# Altium schematic symbol library Linear Technology Comparators.SchLib: 630 symbols (part 12 of 16)
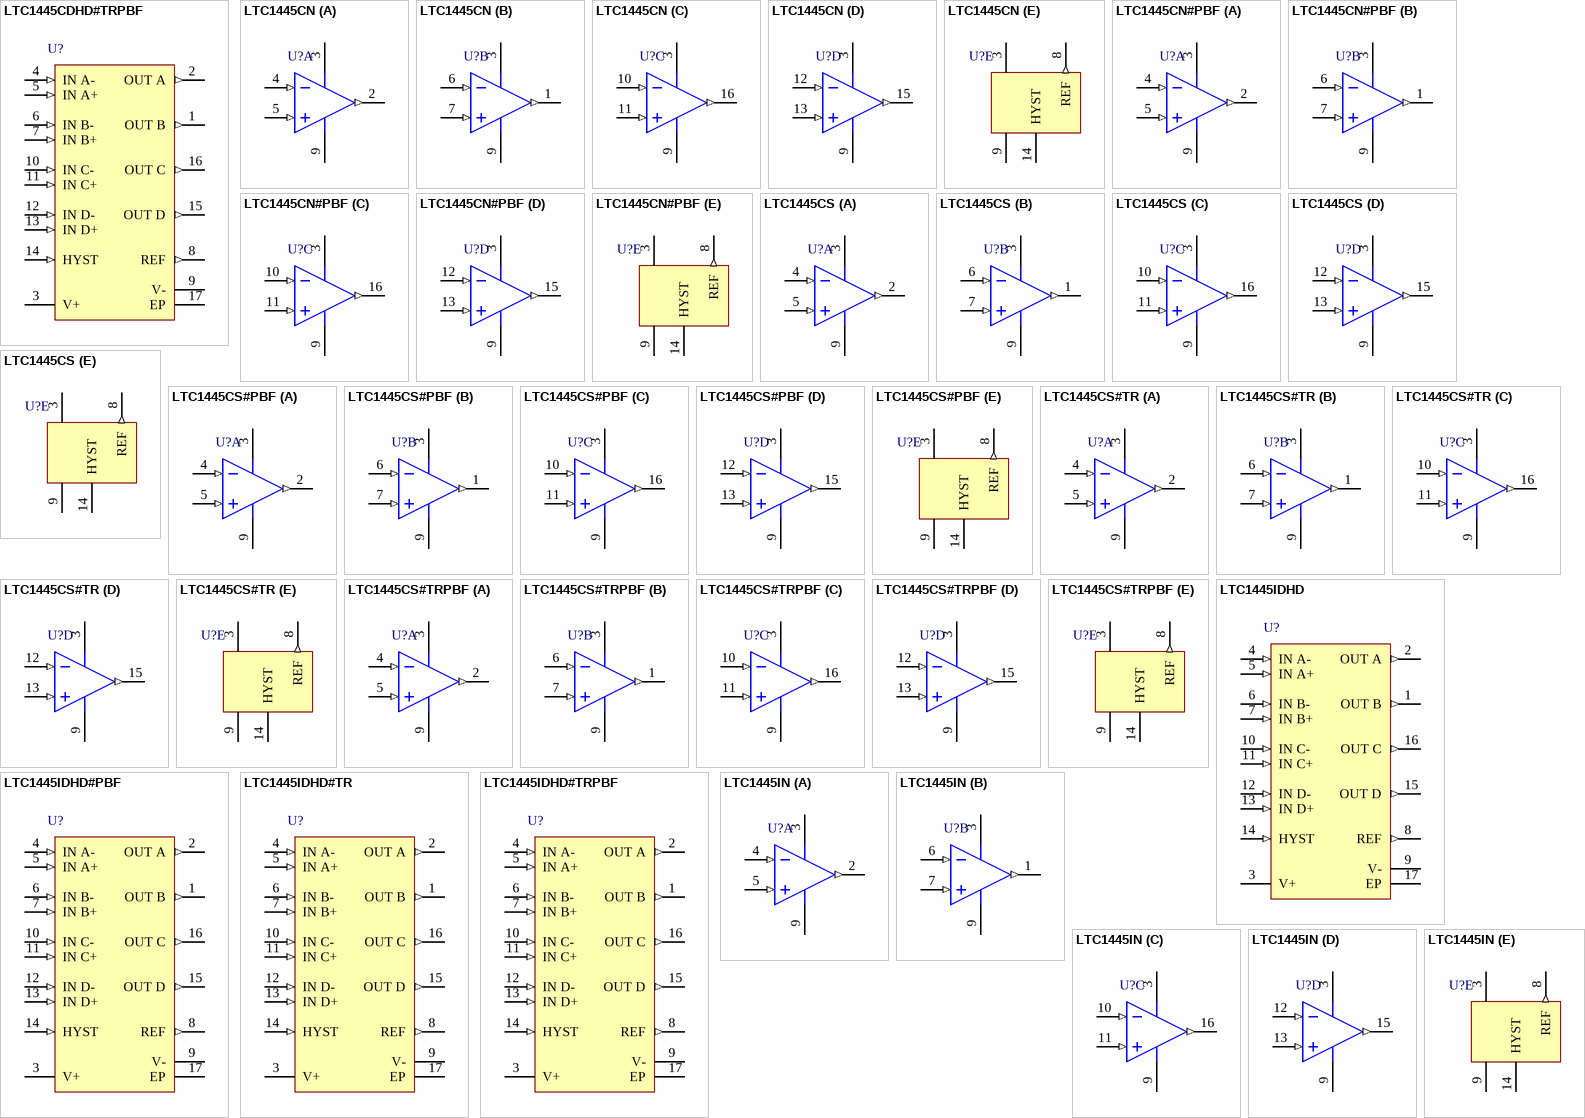
[diagram p35: symbols LTC1445CDHD#TRPBF to LTC1445IN]

## LTC1445IDHD#TRPBF
designator U?
Ultralow Power Comparator with Reference, 4 Channels, 2 to 11 V, -40 to +85 degC, 16-pin Plastic DFN (DHD16), Tape and Reel; Generic Part Number: LTC1445; Manufacturer: Linear Technology; PartNumber: LTC1445IDHD#TRPBF; Channels (#): 4; Supply Current (uA) Guaranteed: 8.5; Supply Current (uA) Typical: 5.5; Supply Voltage Range: 2 to 11 V; Vos (mV) Typical: 3; Vs Max (V): 11; Vs Min (V): 2; DatasheetVersion: Rev E; PackageReference: DHD16; PackageDescription: 16-Pin Plastic DFN, Body 5 × 4 mm, Pitch 0.5 mm; Supplier 1: Digi-Key; Supplier Part Number 1: LTC1445IDHD#TRPBF-ND; Features: Reference, Comparator; Prop Delay (us): 4; RoHS: Y; Mounting Technology: Surface Mount; Code_JEDEC: MO-229; ComponentLink1Description: Manufacturer URL; ComponentLink1URL: http://www.linear.com/; ComponentLink2Description: Datasheet; ComponentLink2URL: http://cds.linear.com/docs/en/datasheet/144345fe.pdf; ComponentLink3Description: Package Specification; ComponentLink3URL: http://cds.linear.com/docs/en/packaging/DFN_16_05-08-1707.pdf
footprint LT-DHD16_V (SON, 16-Leads, Body 5x4mm, Pitch 0.5mm, Thermal Pad 4.34x2.44mm)
pins: 1 OUT B (out) "Comparator B Output. Output can source up to 40mA and sink 5mA.", 2 OUT A (out) "Comparator A Output. Output can source up to 40mA and sink 5mA.", 3 V+ (power) "Positive Supply.", 4 IN A- (in) "Inverting Input of Comparator A. Input common mode range from V- to V+ - 1.3V. Input current typically 10pA at 25degreesC.", 5 IN A+ (in) "Noninverting Input of Comparator A. Inputcommon mode range from V- to V+ -1.3V. Input current typically 10pA at 25degreesC.", 6 IN B- (in) "Inverting Input of Comparator B. Input common mode range from V- to V+ - 1.3V. Input current typically 10pA at 25degreesC.", 7 IN B+ (in) "Noninverting Input of Comparator B. Inputcommon mode range from V- to V+ -1.3V. Input current typically 10pA at 25degreesC.", 8 REF (out) "Reference Output. With respect to V-. Can source up to 200uA and sink 15uA at 25degreesC. Drive 0.01uF bypass capacitor without oscillation.", 9 V- (power) "Negative Supply.", 10 IN C- (in) "Inverting Input of Comparator C. Input common mode range from V- to V+ - 1.3V. Input current typically 10pA at 25degreesC.", 11 IN C+ (in) "Noninverting Input of Comparator C. Inputcommon mode range from V- to V+ -1.3V. Input current typically 10pA at 25degreesC.", 12 IN D- (in) "Inverting Input of Comparator D. Input common mode range from V- to V+ - 1.3V. Input current typically 10pA at 25degreesC.", 13 IN D+ (in) "Noninverting Input of ComparatorD. Inputcommon mode range from V- to V+ -1.3V. Input current typically 10pA at 25degreesC.", 14 HYST (in) "Hysteresis Input. Connect to REF if not used. Input voltage range is from VREF to VREF -50mV.", 15 OUT D (out) "Comparator D Output. Output can source up to 40mA and sink 5mA.", 16 OUT C (out) "Comparator C Output. Output can source up to 40mA and sink 5mA.", 17 EP "This pin is internally connected to V-. Connection is optional, but will improve thermal dissipation."

## LTC1445IN
designator U?
Ultralow Power Comparator with Reference, 4 Channels, 2 to 11 V, -40 to +85 degC, 16-pin PDIP (N16); Generic Part Number: LTC1445; Manufacturer: Linear Technology; PartNumber: LTC1445IN; Channels (#): 4; Supply Current (uA) Guaranteed: 8.5; Supply Current (uA) Typical: 5.5; Supply Voltage Range: 2 to 11 V; Vos (mV) Typical: 3; Vs Max (V): 11; Vs Min (V): 2; DatasheetVersion: Rev E; PackageReference: N16; PackageDescription: 16-Pin PDIP, Body 19.305 x 6.35 mm, Pitch 2.54 mm; Features: Reference, Comparator; Prop Delay (us): 4; RoHS: N; Mounting Technology: Through Hole; ComponentLink1Description: Manufacturer URL; ComponentLink1URL: http://www.linear.com/; ComponentLink2Description: Datasheet; ComponentLink2URL: http://cds.linear.com/docs/en/datasheet/144345fe.pdf; ComponentLink3Description: Package Specification; ComponentLink3URL: http://cds.linear.com/docs/en/packaging/05081510_I_N16.pdf
footprint LT-N16 (DIP, 16-Leads, Body 19.558x6.477mm, Pitch 2.54mm)
pins on every part: 3 V+ (power), 9 V- (power)
part A pins: 2 OUTA (out), 4 INA- (in), 5 INA+ (in)
part B pins: 1 OUTB (out), 6 INB- (in), 7 INB+ (in)
part C pins: 10 INC- (in), 11 INC+ (in), 16 OUTC (out)
part D pins: 12 IND- (in), 13 IND+ (in), 15 OUTD (out)
part E pins: 8 REF (out), 14 HYST

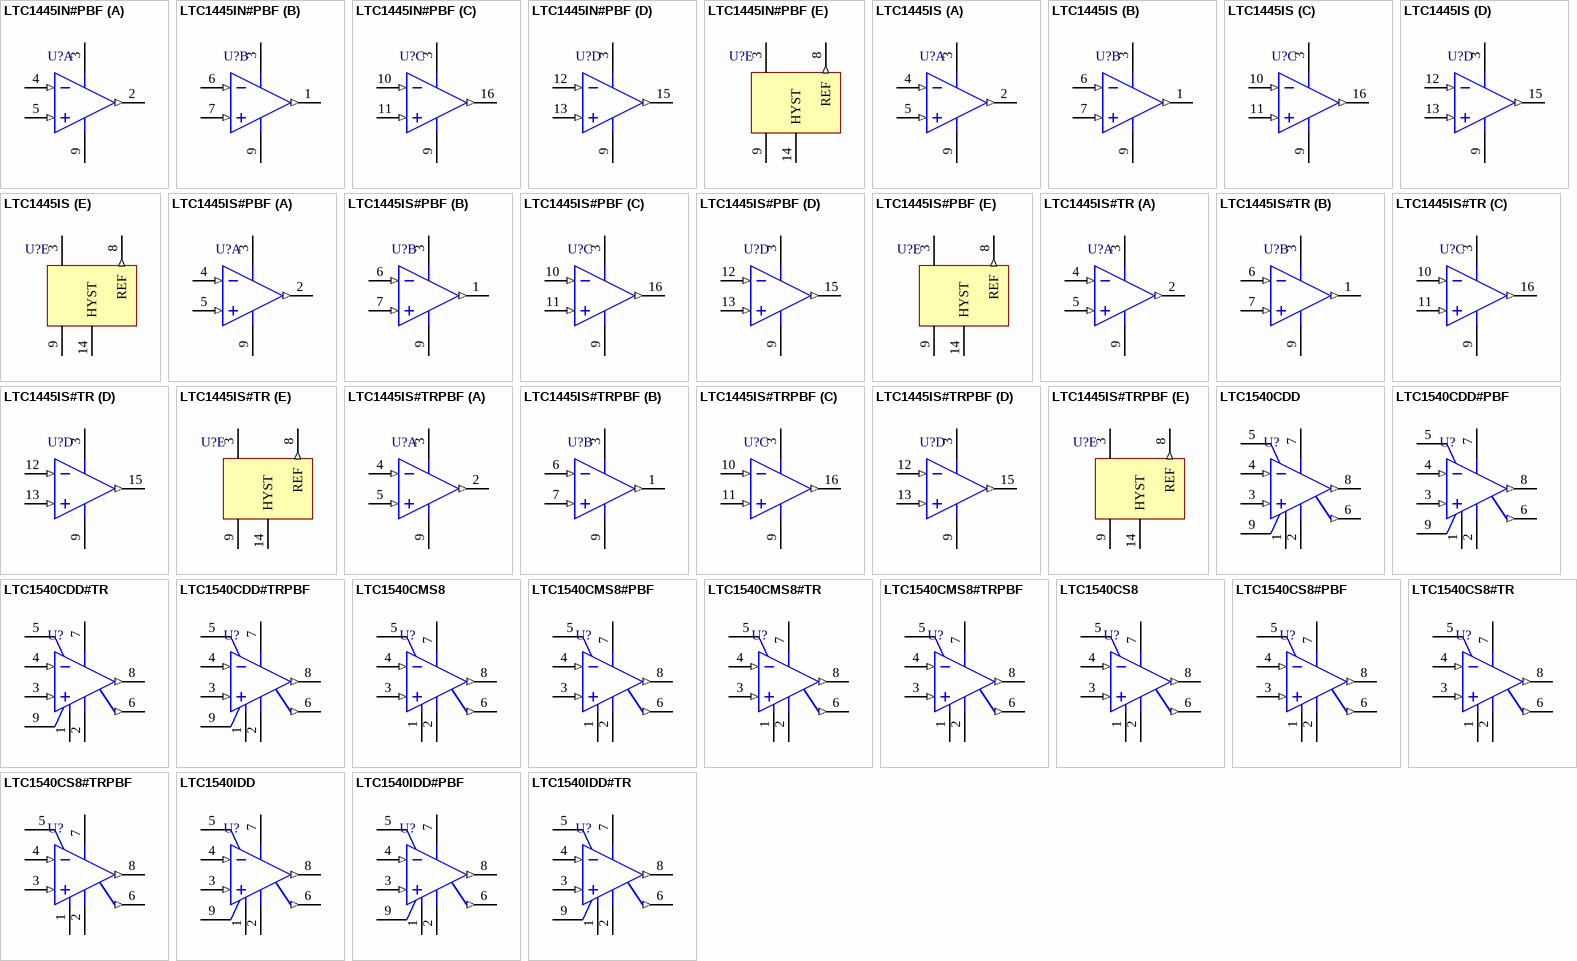
[diagram p19: symbols LTC1445IN#PBF to LTC1540IDD#TR]

## LTC1445IN#PBF
designator U?
Ultralow Power Comparator with Reference, 4 Channels, 2 to 11 V, -40 to +85 degC, 16-pin PDIP (N16); Generic Part Number: LTC1445; Manufacturer: Linear Technology; PartNumber: LTC1445IN#PBF; Channels (#): 4; Supply Current (uA) Guaranteed: 8.5; Supply Current (uA) Typical: 5.5; Supply Voltage Range: 2 to 11 V; Vos (mV) Typical: 3; Vs Max (V): 11; Vs Min (V): 2; DatasheetVersion: Rev E; PackageReference: N16; PackageDescription: 16-Pin PDIP, Body 19.305 x 6.35 mm, Pitch 2.54 mm; Supplier 1: Digi-Key; Supplier Part Number 1: LTC1445IN#PBF-ND; Features: Reference, Comparator; Prop Delay (us): 4; RoHS: Y; Mounting Technology: Through Hole; ComponentLink1Description: Manufacturer URL; ComponentLink1URL: http://www.linear.com/; ComponentLink2Description: Datasheet; ComponentLink2URL: http://cds.linear.com/docs/en/datasheet/144345fe.pdf; ComponentLink3Description: Package Specification; ComponentLink3URL: http://cds.linear.com/docs/en/packaging/05081510_I_N16.pdf
footprint LT-N16 (DIP, 16-Leads, Body 19.558x6.477mm, Pitch 2.54mm)
pins on every part: 3 V+ (power), 9 V- (power)
part A pins: 2 OUTA (out), 4 INA- (in), 5 INA+ (in)
part B pins: 1 OUTB (out), 6 INB- (in), 7 INB+ (in)
part C pins: 10 INC- (in), 11 INC+ (in), 16 OUTC (out)
part D pins: 12 IND- (in), 13 IND+ (in), 15 OUTD (out)
part E pins: 8 REF (out), 14 HYST

## LTC1445IS
designator U?
Ultralow Power Comparator with Reference, 4 Channels, 2 to 11 V, -40 to +85 degC, 16-pin SOP (S16); Generic Part Number: LTC1445; Manufacturer: Linear Technology; PartNumber: LTC1445IS; Channels (#): 4; Supply Current (uA) Guaranteed: 8.5; Supply Current (uA) Typical: 5.5; Supply Voltage Range: 2 to 11 V; Vos (mV) Typical: 3; Vs Max (V): 11; Vs Min (V): 2; DatasheetVersion: Rev E; PackageReference: S16; PackageDescription: 16-Pin Plastic Small Outline, Body 9.91 x 3.9 mm, Pitch 1.27 mm; Supplier 1: Digi-Key; Supplier Part Number 1: LTC1445IS-ND; Supplier 2: Newark; Supplier Part Number 2: 56M1277; Features: Reference, Comparator; Prop Delay (us): 4; RoHS: N; Mounting Technology: Surface Mount; ComponentLink1Description: Manufacturer URL; ComponentLink1URL: http://www.linear.com/; ComponentLink2Description: Datasheet; ComponentLink2URL: http://cds.linear.com/docs/en/datasheet/144345fe.pdf; ComponentLink3Description: Package Specification; ComponentLink3URL: http://cds.linear.com/docs/en/packaging/05081610_G_S14.pdf
footprint LT-S16_N (SOIC, 16-Leads, Body 9.9x3.9mm, Pitch 1.27mm, IPC Medium Density)
footprint LT-S16_L (SOIC, 16-Leads, Body 9.9x3.9mm, Pitch 1.27mm, IPC High Density)
footprint LT-S16_M (SOIC, 16-Leads, Body 9.9x3.9mm, Pitch 1.27mm, IPC Low Density)
pins on every part: 3 V+ (power), 9 V- (power)
part A pins: 2 OUTA (out), 4 INA- (in), 5 INA+ (in)
part B pins: 1 OUTB (out), 6 INB- (in), 7 INB+ (in)
part C pins: 10 INC- (in), 11 INC+ (in), 16 OUTC (out)
part D pins: 12 IND- (in), 13 IND+ (in), 15 OUTD (out)
part E pins: 8 REF (out), 14 HYST

## LTC1445IS#PBF
designator U?
Ultralow Power Comparator with Reference, 4 Channels, 2 to 11 V, -40 to +85 degC, 16-pin SOP (S16); Generic Part Number: LTC1445; Manufacturer: Linear Technology; PartNumber: LTC1445IS#PBF; Channels (#): 4; Supply Current (uA) Guaranteed: 8.5; Supply Current (uA) Typical: 5.5; Supply Voltage Range: 2 to 11 V; Vos (mV) Typical: 3; Vs Max (V): 11; Vs Min (V): 2; DatasheetVersion: Rev E; PackageReference: S16; PackageDescription: 16-Pin Plastic Small Outline, Body 9.91 x 3.9 mm, Pitch 1.27 mm; Supplier 1: Digi-Key; Supplier Part Number 1: LTC1445IS#PBF-ND; Supplier 2: Farnell; Supplier Part Number 2: 2294789; Supplier 3: Newark; Supplier Part Number 3: 56M1278; Features: Reference, Comparator; Prop Delay (us): 4; RoHS: Y; Mounting Technology: Surface Mount; ComponentLink1Description: Manufacturer URL; ComponentLink1URL: http://www.linear.com/; ComponentLink2Description: Datasheet; ComponentLink2URL: http://cds.linear.com/docs/en/datasheet/144345fe.pdf; ComponentLink3Description: Package Specification; ComponentLink3URL: http://cds.linear.com/docs/en/packaging/05081610_G_S14.pdf
footprint LT-S16_N (SOIC, 16-Leads, Body 9.9x3.9mm, Pitch 1.27mm, IPC Medium Density)
footprint LT-S16_L (SOIC, 16-Leads, Body 9.9x3.9mm, Pitch 1.27mm, IPC High Density)
footprint LT-S16_M (SOIC, 16-Leads, Body 9.9x3.9mm, Pitch 1.27mm, IPC Low Density)
pins on every part: 3 V+ (power), 9 V- (power)
part A pins: 2 OUTA (out), 4 INA- (in), 5 INA+ (in)
part B pins: 1 OUTB (out), 6 INB- (in), 7 INB+ (in)
part C pins: 10 INC- (in), 11 INC+ (in), 16 OUTC (out)
part D pins: 12 IND- (in), 13 IND+ (in), 15 OUTD (out)
part E pins: 8 REF (out), 14 HYST

## LTC1445IS#TR
designator U?
Ultralow Power Comparator with Reference, 4 Channels, 2 to 11 V, -40 to +85 degC, 16-pin SOP (S16), Tape and Reel; Generic Part Number: LTC1445; Manufacturer: Linear Technology; PartNumber: LTC1445IS#TR; Channels (#): 4; Supply Current (uA) Guaranteed: 8.5; Supply Current (uA) Typical: 5.5; Supply Voltage Range: 2 to 11 V; Vos (mV) Typical: 3; Vs Max (V): 11; Vs Min (V): 2; DatasheetVersion: Rev E; PackageReference: S16; PackageDescription: 16-Pin Plastic Small Outline, Body 9.91 x 3.9 mm, Pitch 1.27 mm; Supplier 1: Digi-Key; Supplier Part Number 1: LTC1445IS#TR-ND; Supplier 2: Newark; Supplier Part Number 2: 56M1279; Features: Reference, Comparator; Prop Delay (us): 4; RoHS: N; Mounting Technology: Surface Mount; ComponentLink1Description: Manufacturer URL; ComponentLink1URL: http://www.linear.com/; ComponentLink2Description: Datasheet; ComponentLink2URL: http://cds.linear.com/docs/en/datasheet/144345fe.pdf; ComponentLink3Description: Package Specification; ComponentLink3URL: http://cds.linear.com/docs/en/packaging/05081610_G_S14.pdf
footprint LT-S16_N (SOIC, 16-Leads, Body 9.9x3.9mm, Pitch 1.27mm, IPC Medium Density)
footprint LT-S16_L (SOIC, 16-Leads, Body 9.9x3.9mm, Pitch 1.27mm, IPC High Density)
footprint LT-S16_M (SOIC, 16-Leads, Body 9.9x3.9mm, Pitch 1.27mm, IPC Low Density)
pins on every part: 3 V+ (power), 9 V- (power)
part A pins: 2 OUTA (out), 4 INA- (in), 5 INA+ (in)
part B pins: 1 OUTB (out), 6 INB- (in), 7 INB+ (in)
part C pins: 10 INC- (in), 11 INC+ (in), 16 OUTC (out)
part D pins: 12 IND- (in), 13 IND+ (in), 15 OUTD (out)
part E pins: 8 REF (out), 14 HYST

## LTC1445IS#TRPBF
designator U?
Ultralow Power Comparator with Reference, 4 Channels, 2 to 11 V, -40 to +85 degC, 16-pin SOP (S16), Tape and Reel; Generic Part Number: LTC1445; Manufacturer: Linear Technology; PartNumber: LTC1445IS#TRPBF; Channels (#): 4; Supply Current (uA) Guaranteed: 8.5; Supply Current (uA) Typical: 5.5; Supply Voltage Range: 2 to 11 V; Vos (mV) Typical: 3; Vs Max (V): 11; Vs Min (V): 2; DatasheetVersion: Rev E; PackageReference: S16; PackageDescription: 16-Pin Plastic Small Outline, Body 9.91 x 3.9 mm, Pitch 1.27 mm; Supplier 1: Digi-Key; Supplier Part Number 1: LTC1445IS#TRPBF-ND; Supplier 2: Newark; Supplier Part Number 2: 78T2496; Features: Reference, Comparator; Prop Delay (us): 4; RoHS: Y; Mounting Technology: Surface Mount; ComponentLink1Description: Manufacturer URL; ComponentLink1URL: http://www.linear.com/; ComponentLink2Description: Datasheet; ComponentLink2URL: http://cds.linear.com/docs/en/datasheet/144345fe.pdf; ComponentLink3Description: Package Specification; ComponentLink3URL: http://cds.linear.com/docs/en/packaging/05081610_G_S14.pdf
footprint LT-S16_N (SOIC, 16-Leads, Body 9.9x3.9mm, Pitch 1.27mm, IPC Medium Density)
footprint LT-S16_L (SOIC, 16-Leads, Body 9.9x3.9mm, Pitch 1.27mm, IPC High Density)
footprint LT-S16_M (SOIC, 16-Leads, Body 9.9x3.9mm, Pitch 1.27mm, IPC Low Density)
pins on every part: 3 V+ (power), 9 V- (power)
part A pins: 2 OUTA (out), 4 INA- (in), 5 INA+ (in)
part B pins: 1 OUTB (out), 6 INB- (in), 7 INB+ (in)
part C pins: 10 INC- (in), 11 INC+ (in), 16 OUTC (out)
part D pins: 12 IND- (in), 13 IND+ (in), 15 OUTD (out)
part E pins: 8 REF (out), 14 HYST

## LTC1540CDD
designator U?
Nanopower Comparator with Reference, 1 Channel, 2 to 11 V, 0 to +70 degC, 8-pin Plastic DFN (DD8); Generic Part Number: LTC1540; Manufacturer: Linear Technology; PartNumber: LTC1540CDD; Channels (#): 1; Prop Delay (us): 50; Supply Current (uA) Guaranteed: 0.68; Supply Current (uA) Typical: 0.3; Supply Voltage Range: 2 to 11 V; Vos (mV) Guaranteed: 12; Vs Max (V): 11; Vs Min (V): 2; DatasheetVersion: Rev A; PackageReference: DD8; PackageDescription: 8-Pin Plastic DFN, Body 3 × 3 mm, Pitch 0.5 mm; Supplier 1: Digi-Key; Supplier Part Number 1: LTC1540CDD-ND; Features: Reference, Comparator; RoHS: N; Vos (mV) Typical: 12; Mounting Technology: Surface Mount; Code_JEDEC: M0-229; ComponentLink1Description: Manufacturer URL; ComponentLink1URL: http://www.linear.com/; ComponentLink2Description: Datasheet; ComponentLink2URL: http://cds.linear.com/docs/en/datasheet/1540fas.pdf; ComponentLink3Description: Package Specification; ComponentLink3URL: http://cds.linear.com/docs/en/packaging/DFN_8_05-08-1698.pdf
footprint LT-DD8_V (SON, 8-Leads, Body 3x3mm, Pitch 0.5mm, Thermal Pad 2.38x1.65mm)
pins: 1 GND (power) "Ground. Connect to V- for single supply operation.", 2 V- (power) "Negative Supply. Potential should be more negative than GND. Connect to ground for single supply operation.", 3 IN+ (in) "Noninverting Comparator Input. Input common mode range from V- to V+ -1.3V. Input current typically 10pA at 25degreesC.", 4 IN- (in) "Inverting Comparator Input. Input common mode range from V- to V+ -1.3V. Input current typically 10pA at 25degreesC.", 5 HYST "Hysteresis Input. Connect to REF if not used. Input voltage range is from VREF to VREF-50mV.", 6 REF (out) "Reference Output. 1.182V with respect to V-. Can source up to 1mA and sink 10uA at 25degreesC. Drive 0.01uF bypass capacitor without oscillation.", 7 V+ (power) "Positive Supply operating voltage is from 2V to 11V.", 8 OUT (out) "Comparator CMOS Output. Swings from GND to V+. Output can source up to 40mA and sink 5mA.", 9 EP (power) "Exposed Pad"

## LTC1540CDD#PBF
designator U?
Nanopower Comparator with Reference, 1 Channel, 2 to 11 V, 0 to +70 degC, 8-pin Plastic DFN (DD8); Generic Part Number: LTC1540; Manufacturer: Linear Technology; PartNumber: LTC1540CDD#PBF; Channels (#): 1; Prop Delay (us): 50; Supply Current (uA) Guaranteed: 0.68; Supply Current (uA) Typical: 0.3; Supply Voltage Range: 2 to 11 V; Vos (mV) Guaranteed: 12; Vs Max (V): 11; Vs Min (V): 2; DatasheetVersion: Rev A; PackageReference: DD8; PackageDescription: 8-Pin Plastic DFN, Body 3 × 3 mm, Pitch 0.5 mm; Supplier 1: Digi-Key; Supplier Part Number 1: LTC1540CDD#PBF-ND; Supplier 2: Farnell; Supplier Part Number 2: 2295500; Supplier 3: Newark; Supplier Part Number 3: 56M1857; Features: Reference, Comparator; RoHS: Y; Vos (mV) Typical: 12; Mounting Technology: Surface Mount; Code_JEDEC: M0-229; ComponentLink1Description: Manufacturer URL; ComponentLink1URL: http://www.linear.com/; ComponentLink2Description: Datasheet; ComponentLink2URL: http://cds.linear.com/docs/en/datasheet/1540fas.pdf; ComponentLink3Description: Package Specification; ComponentLink3URL: http://cds.linear.com/docs/en/packaging/DFN_8_05-08-1698.pdf
footprint LT-DD8_V (SON, 8-Leads, Body 3x3mm, Pitch 0.5mm, Thermal Pad 2.38x1.65mm)
pins: 1 GND (power) "Ground. Connect to V- for single supply operation.", 2 V- (power) "Negative Supply. Potential should be more negative than GND. Connect to ground for single supply operation.", 3 IN+ (in) "Noninverting Comparator Input. Input common mode range from V- to V+ -1.3V. Input current typically 10pA at 25degreesC.", 4 IN- (in) "Inverting Comparator Input. Input common mode range from V- to V+ -1.3V. Input current typically 10pA at 25degreesC.", 5 HYST "Hysteresis Input. Connect to REF if not used. Input voltage range is from VREF to VREF-50mV.", 6 REF (out) "Reference Output. 1.182V with respect to V-. Can source up to 1mA and sink 10uA at 25degreesC. Drive 0.01uF bypass capacitor without oscillation.", 7 V+ (power) "Positive Supply operating voltage is from 2V to 11V.", 8 OUT (out) "Comparator CMOS Output. Swings from GND to V+. Output can source up to 40mA and sink 5mA.", 9 EP (power) "Exposed Pad"

## LTC1540CDD#TR
designator U?
Nanopower Comparator with Reference, 1 Channel, 2 to 11 V, 0 to +70 degC, 8-pin Plastic DFN (DD8), Tape and Reel; Generic Part Number: LTC1540; Manufacturer: Linear Technology; PartNumber: LTC1540CDD#TR; Channels (#): 1; Prop Delay (us): 50; Supply Current (uA) Guaranteed: 0.68; Supply Current (uA) Typical: 0.3; Supply Voltage Range: 2 to 11 V; Vos (mV) Guaranteed: 12; Vs Max (V): 11; Vs Min (V): 2; DatasheetVersion: Rev A; PackageReference: DD8; PackageDescription: 8-Pin Plastic DFN, Body 3 × 3 mm, Pitch 0.5 mm; Supplier 1: Digi-Key; Supplier Part Number 1: LTC1540CDD#TR-ND; Features: Reference, Comparator; RoHS: N; Vos (mV) Typical: 12; Mounting Technology: Surface Mount; Code_JEDEC: M0-229; ComponentLink1Description: Manufacturer URL; ComponentLink1URL: http://www.linear.com/; ComponentLink2Description: Datasheet; ComponentLink2URL: http://cds.linear.com/docs/en/datasheet/1540fas.pdf; ComponentLink3Description: Package Specification; ComponentLink3URL: http://cds.linear.com/docs/en/packaging/DFN_8_05-08-1698.pdf
footprint LT-DD8_V (SON, 8-Leads, Body 3x3mm, Pitch 0.5mm, Thermal Pad 2.38x1.65mm)
pins: 1 GND (power) "Ground. Connect to V- for single supply operation.", 2 V- (power) "Negative Supply. Potential should be more negative than GND. Connect to ground for single supply operation.", 3 IN+ (in) "Noninverting Comparator Input. Input common mode range from V- to V+ -1.3V. Input current typically 10pA at 25degreesC.", 4 IN- (in) "Inverting Comparator Input. Input common mode range from V- to V+ -1.3V. Input current typically 10pA at 25degreesC.", 5 HYST "Hysteresis Input. Connect to REF if not used. Input voltage range is from VREF to VREF-50mV.", 6 REF (out) "Reference Output. 1.182V with respect to V-. Can source up to 1mA and sink 10uA at 25degreesC. Drive 0.01uF bypass capacitor without oscillation.", 7 V+ (power) "Positive Supply operating voltage is from 2V to 11V.", 8 OUT (out) "Comparator CMOS Output. Swings from GND to V+. Output can source up to 40mA and sink 5mA.", 9 EP (power) "Exposed Pad"

## LTC1540CDD#TRPBF
designator U?
Nanopower Comparator with Reference, 1 Channel, 2 to 11 V, 0 to +70 degC, 8-pin Plastic DFN (DD8), Tape and Reel; Generic Part Number: LTC1540; Manufacturer: Linear Technology; PartNumber: LTC1540CDD#TRPBF; Channels (#): 1; Prop Delay (us): 50; Supply Current (uA) Guaranteed: 0.68; Supply Current (uA) Typical: 0.3; Supply Voltage Range: 2 to 11 V; Vos (mV) Guaranteed: 12; Vs Max (V): 11; Vs Min (V): 2; DatasheetVersion: Rev A; PackageReference: DD8; PackageDescription: 8-Pin Plastic DFN, Body 3 × 3 mm, Pitch 0.5 mm; Supplier 1: Digi-Key; Supplier Part Number 1: LTC1540CDD#TRPBF-ND; Features: Reference, Comparator; RoHS: Y; Vos (mV) Typical: 12; Mounting Technology: Surface Mount; Code_JEDEC: M0-229; ComponentLink1Description: Manufacturer URL; ComponentLink1URL: http://www.linear.com/; ComponentLink2Description: Datasheet; ComponentLink2URL: http://cds.linear.com/docs/en/datasheet/1540fas.pdf; ComponentLink3Description: Package Specification; ComponentLink3URL: http://cds.linear.com/docs/en/packaging/DFN_8_05-08-1698.pdf
footprint LT-DD8_V (SON, 8-Leads, Body 3x3mm, Pitch 0.5mm, Thermal Pad 2.38x1.65mm)
pins: 1 GND (power) "Ground. Connect to V- for single supply operation.", 2 V- (power) "Negative Supply. Potential should be more negative than GND. Connect to ground for single supply operation.", 3 IN+ (in) "Noninverting Comparator Input. Input common mode range from V- to V+ -1.3V. Input current typically 10pA at 25degreesC.", 4 IN- (in) "Inverting Comparator Input. Input common mode range from V- to V+ -1.3V. Input current typically 10pA at 25degreesC.", 5 HYST "Hysteresis Input. Connect to REF if not used. Input voltage range is from VREF to VREF-50mV.", 6 REF (out) "Reference Output. 1.182V with respect to V-. Can source up to 1mA and sink 10uA at 25degreesC. Drive 0.01uF bypass capacitor without oscillation.", 7 V+ (power) "Positive Supply operating voltage is from 2V to 11V.", 8 OUT (out) "Comparator CMOS Output. Swings from GND to V+. Output can source up to 40mA and sink 5mA.", 9 EP (power) "Exposed Pad"

## LTC1540CMS8
designator U?
Nanopower Comparator with Reference, 1 Channel, 2 to 11 V, 0 to +70 degC, 8-pin Plastic MSOP (MS8); Generic Part Number: LTC1540; Manufacturer: Linear Technology; PartNumber: LTC1540CMS8; Channels (#): 1; Prop Delay (us): 50; Supply Current (uA) Guaranteed: 0.68; Supply Current (uA) Typical: 0.3; Supply Voltage Range: 2 to 11 V; Vos (mV) Guaranteed: 12; Vs Max (V): 11; Vs Min (V): 2; DatasheetVersion: Rev A; PackageReference: MS8; PackageDescription: 8-Pin Plastic MSOP, Body 3 x 3 mm, Pitch 0.65 mm; Supplier 1: Digi-Key; Supplier Part Number 1: LTC1540CMS8-ND; Supplier 2: Newark; Supplier Part Number 2: 56M1860; Features: Reference, Comparator; RoHS: N; Vos (mV) Typical: 12; Mounting Technology: Surface Mount; ComponentLink1Description: Manufacturer URL; ComponentLink1URL: http://www.linear.com/; ComponentLink2Description: Datasheet; ComponentLink2URL: http://cds.linear.com/docs/en/datasheet/1540fas.pdf; ComponentLink3Description: Package Specification; ComponentLink3URL: http://cds.linear.com/docs/en/packaging/MSOP_8_05-08-1660.pdf
footprint LT-MS8_N (SOP, 8-Leads, Body 3x3mm, Pitch 0.65mm, IPC Medium Density)
footprint LT-MS8_L (SOP, 8-Leads, Body 3x3mm, Pitch 0.65mm, IPC High Density)
footprint LT-MS8_M (SOP, 8-Leads, Body 3x3mm, Pitch 0.65mm, IPC Low Density)
pins: 1 GND (power), 2 V- (power), 3 IN+ (in), 4 IN- (in), 5 HYST, 6 REF (out), 7 V+ (power), 8 OUT (out)

## LTC1540CMS8#PBF
designator U?
Nanopower Comparator with Reference, 1 Channel, 2 to 11 V, 0 to +70 degC, 8-pin Plastic MSOP (MS8); Generic Part Number: LTC1540; Manufacturer: Linear Technology; PartNumber: LTC1540CMS8#PBF; Channels (#): 1; Prop Delay (us): 50; Supply Current (uA) Guaranteed: 0.68; Supply Current (uA) Typical: 0.3; Supply Voltage Range: 2 to 11 V; Vos (mV) Guaranteed: 12; Vs Max (V): 11; Vs Min (V): 2; DatasheetVersion: Rev A; PackageReference: MS8; PackageDescription: 8-Pin Plastic MSOP, Body 3 x 3 mm, Pitch 0.65 mm; Supplier 1: Digi-Key; Supplier Part Number 1: LTC1540CMS8#PBF-ND; Supplier 2: Farnell; Supplier Part Number 2: 1663643; Supplier 3: Newark; Supplier Part Number 3: 56M1861; Features: Reference, Comparator; RoHS: Y; Vos (mV) Typical: 12; Mounting Technology: Surface Mount; ComponentLink1Description: Manufacturer URL; ComponentLink1URL: http://www.linear.com/; ComponentLink2Description: Datasheet; ComponentLink2URL: http://cds.linear.com/docs/en/datasheet/1540fas.pdf; ComponentLink3Description: Package Specification; ComponentLink3URL: http://cds.linear.com/docs/en/packaging/MSOP_8_05-08-1660.pdf
footprint LT-MS8_N (SOP, 8-Leads, Body 3x3mm, Pitch 0.65mm, IPC Medium Density)
footprint LT-MS8_L (SOP, 8-Leads, Body 3x3mm, Pitch 0.65mm, IPC High Density)
footprint LT-MS8_M (SOP, 8-Leads, Body 3x3mm, Pitch 0.65mm, IPC Low Density)
pins: 1 GND (power), 2 V- (power), 3 IN+ (in), 4 IN- (in), 5 HYST, 6 REF (out), 7 V+ (power), 8 OUT (out)

## LTC1540CMS8#TR
designator U?
Nanopower Comparator with Reference, 1 Channel, 2 to 11 V, 0 to +70 degC, 8-pin Plastic MSOP (MS8), Tape and Reel; Generic Part Number: LTC1540; Manufacturer: Linear Technology; PartNumber: LTC1540CMS8#TR; Channels (#): 1; Prop Delay (us): 50; Supply Current (uA) Guaranteed: 0.68; Supply Current (uA) Typical: 0.3; Supply Voltage Range: 2 to 11 V; Vos (mV) Guaranteed: 12; Vs Max (V): 11; Vs Min (V): 2; DatasheetVersion: Rev A; PackageReference: MS8; PackageDescription: 8-Pin Plastic MSOP, Body 3 x 3 mm, Pitch 0.65 mm; Supplier 1: Digi-Key; Supplier Part Number 1: LTC1540CMS8#TR-ND; Supplier 2: Newark; Supplier Part Number 2: 56M1862; Features: Reference, Comparator; RoHS: N; Vos (mV) Typical: 12; Mounting Technology: Surface Mount; ComponentLink1Description: Manufacturer URL; ComponentLink1URL: http://www.linear.com/; ComponentLink2Description: Datasheet; ComponentLink2URL: http://cds.linear.com/docs/en/datasheet/1540fas.pdf; ComponentLink3Description: Package Specification; ComponentLink3URL: http://cds.linear.com/docs/en/packaging/MSOP_8_05-08-1660.pdf
footprint LT-MS8_N (SOP, 8-Leads, Body 3x3mm, Pitch 0.65mm, IPC Medium Density)
footprint LT-MS8_L (SOP, 8-Leads, Body 3x3mm, Pitch 0.65mm, IPC High Density)
footprint LT-MS8_M (SOP, 8-Leads, Body 3x3mm, Pitch 0.65mm, IPC Low Density)
pins: 1 GND (power), 2 V- (power), 3 IN+ (in), 4 IN- (in), 5 HYST, 6 REF (out), 7 V+ (power), 8 OUT (out)

## LTC1540CMS8#TRPBF
designator U?
Nanopower Comparator with Reference, 1 Channel, 2 to 11 V, 0 to +70 degC, 8-pin Plastic MSOP (MS8), Tape and Reel; Generic Part Number: LTC1540; Manufacturer: Linear Technology; PartNumber: LTC1540CMS8#TRPBF; Channels (#): 1; Prop Delay (us): 50; Supply Current (uA) Guaranteed: 0.68; Supply Current (uA) Typical: 0.3; Supply Voltage Range: 2 to 11 V; Vos (mV) Guaranteed: 12; Vs Max (V): 11; Vs Min (V): 2; DatasheetVersion: Rev A; PackageReference: MS8; PackageDescription: 8-Pin Plastic MSOP, Body 3 x 3 mm, Pitch 0.65 mm; Supplier 1: Digi-Key; Supplier Part Number 1: LTC1540CMS8#TRPBF-ND; Supplier 2: Newark; Supplier Part Number 2: 56M1863; Features: Reference, Comparator; RoHS: Y; Vos (mV) Typical: 12; Mounting Technology: Surface Mount; ComponentLink1Description: Manufacturer URL; ComponentLink1URL: http://www.linear.com/; ComponentLink2Description: Datasheet; ComponentLink2URL: http://cds.linear.com/docs/en/datasheet/1540fas.pdf; ComponentLink3Description: Package Specification; ComponentLink3URL: http://cds.linear.com/docs/en/packaging/MSOP_8_05-08-1660.pdf
footprint LT-MS8_N (SOP, 8-Leads, Body 3x3mm, Pitch 0.65mm, IPC Medium Density)
footprint LT-MS8_L (SOP, 8-Leads, Body 3x3mm, Pitch 0.65mm, IPC High Density)
footprint LT-MS8_M (SOP, 8-Leads, Body 3x3mm, Pitch 0.65mm, IPC Low Density)
pins: 1 GND (power), 2 V- (power), 3 IN+ (in), 4 IN- (in), 5 HYST, 6 REF (out), 7 V+ (power), 8 OUT (out)

## LTC1540CS8
designator U?
Nanopower Comparator with Reference, 1 Channel, 2 to 11 V, 0 to +70 degC, 8-pin SOP (S8); Generic Part Number: LTC1540; Manufacturer: Linear Technology; PartNumber: LTC1540CS8; Channels (#): 1; Prop Delay (us): 50; Supply Current (uA) Guaranteed: 0.68; Supply Current (uA) Typical: 0.3; Supply Voltage Range: 2 to 11 V; Vos (mV) Guaranteed: 12; Vs Max (V): 11; Vs Min (V): 2; DatasheetVersion: Rev A; PackageReference: S8; PackageDescription: 8-Pin Plastic Small Outline (Narrow .150 Inch), Body 4.9 x 3.9 mm, Pitch 1.27 mm; Supplier 1: Digi-Key; Supplier Part Number 1: LTC1540CS8-ND; Features: Reference, Comparator; RoHS: N; Vos (mV) Typical: 12; Mounting Technology: Surface Mount; ComponentLink1Description: Manufacturer URL; ComponentLink1URL: http://www.linear.com/; ComponentLink2Description: Datasheet; ComponentLink2URL: http://cds.linear.com/docs/en/datasheet/1540fas.pdf; ComponentLink3Description: Package Specification; ComponentLink3URL: http://cds.linear.com/docs/en/packaging/05081610_G_SO8.pdf
footprint LT-S8_N (SOP, 8-Leads, Body 4.9x3.9mm, Pitch 1.27mm, IPC Medium Density)
footprint LT-S8_L (SOP, 8-Leads, Body 4.9x3.9mm, Pitch 1.27mm, IPC High Density)
footprint LT-S8_M (SOP, 8-Leads, Body 4.9x3.9mm, Pitch 1.27mm, IPC Low Density)
pins: 1 GND (power), 2 V- (power), 3 IN+ (in), 4 IN- (in), 5 HYST, 6 REF (out), 7 V+ (power), 8 OUT (out)

## LTC1540CS8#PBF
designator U?
Nanopower Comparator with Reference, 1 Channel, 2 to 11 V, 0 to +70 degC, 8-pin SOP (S8); Generic Part Number: LTC1540; Manufacturer: Linear Technology; PartNumber: LTC1540CS8#PBF; Channels (#): 1; Prop Delay (us): 50; Supply Current (uA) Guaranteed: 0.68; Supply Current (uA) Typical: 0.3; Supply Voltage Range: 2 to 11 V; Vos (mV) Guaranteed: 12; Vs Max (V): 11; Vs Min (V): 2; DatasheetVersion: Rev A; PackageReference: S8; PackageDescription: 8-Pin Plastic Small Outline (Narrow .150 Inch), Body 4.9 x 3.9 mm, Pitch 1.27 mm; Supplier 1: Digi-Key; Supplier Part Number 1: LTC1540CS8#PBF-ND; Supplier 2: Farnell; Supplier Part Number 2: 1651908; Supplier 3: Newark; Supplier Part Number 3: 56M1865; Features: Reference, Comparator; RoHS: Y; Vos (mV) Typical: 12; Mounting Technology: Surface Mount; ComponentLink1Description: Manufacturer URL; ComponentLink1URL: http://www.linear.com/; ComponentLink2Description: Datasheet; ComponentLink2URL: http://cds.linear.com/docs/en/datasheet/1540fas.pdf; ComponentLink3Description: Package Specification; ComponentLink3URL: http://cds.linear.com/docs/en/packaging/05081610_G_SO8.pdf
footprint LT-S8_N (SOP, 8-Leads, Body 4.9x3.9mm, Pitch 1.27mm, IPC Medium Density)
footprint LT-S8_L (SOP, 8-Leads, Body 4.9x3.9mm, Pitch 1.27mm, IPC High Density)
footprint LT-S8_M (SOP, 8-Leads, Body 4.9x3.9mm, Pitch 1.27mm, IPC Low Density)
pins: 1 GND (power), 2 V- (power), 3 IN+ (in), 4 IN- (in), 5 HYST, 6 REF (out), 7 V+ (power), 8 OUT (out)

## LTC1540CS8#TR
designator U?
Nanopower Comparator with Reference, 1 Channel, 2 to 11 V, 0 to +70 degC, 8-pin SOP (S8), Tape and Reel; Generic Part Number: LTC1540; Manufacturer: Linear Technology; PartNumber: LTC1540CS8#TR; Channels (#): 1; Prop Delay (us): 50; Supply Current (uA) Guaranteed: 0.68; Supply Current (uA) Typical: 0.3; Supply Voltage Range: 2 to 11 V; Vos (mV) Guaranteed: 12; Vs Max (V): 11; Vs Min (V): 2; DatasheetVersion: Rev A; PackageReference: S8; PackageDescription: 8-Pin Plastic Small Outline (Narrow .150 Inch), Body 4.9 x 3.9 mm, Pitch 1.27 mm; Supplier 1: Digi-Key; Supplier Part Number 1: LTC1540CS8#TR-ND; Features: Reference, Comparator; RoHS: N; Vos (mV) Typical: 12; Mounting Technology: Surface Mount; ComponentLink1Description: Manufacturer URL; ComponentLink1URL: http://www.linear.com/; ComponentLink2Description: Datasheet; ComponentLink2URL: http://cds.linear.com/docs/en/datasheet/1540fas.pdf; ComponentLink3Description: Package Specification; ComponentLink3URL: http://cds.linear.com/docs/en/packaging/05081610_G_SO8.pdf
footprint LT-S8_N (SOP, 8-Leads, Body 4.9x3.9mm, Pitch 1.27mm, IPC Medium Density)
footprint LT-S8_L (SOP, 8-Leads, Body 4.9x3.9mm, Pitch 1.27mm, IPC High Density)
footprint LT-S8_M (SOP, 8-Leads, Body 4.9x3.9mm, Pitch 1.27mm, IPC Low Density)
pins: 1 GND (power), 2 V- (power), 3 IN+ (in), 4 IN- (in), 5 HYST, 6 REF (out), 7 V+ (power), 8 OUT (out)

## LTC1540CS8#TRPBF
designator U?
Nanopower Comparator with Reference, 1 Channel, 2 to 11 V, 0 to +70 degC, 8-pin SOP (S8), Tape and Reel; Generic Part Number: LTC1540; Manufacturer: Linear Technology; PartNumber: LTC1540CS8#TRPBF; Channels (#): 1; Prop Delay (us): 50; Supply Current (uA) Guaranteed: 0.68; Supply Current (uA) Typical: 0.3; Supply Voltage Range: 2 to 11 V; Vos (mV) Guaranteed: 12; Vs Max (V): 11; Vs Min (V): 2; DatasheetVersion: Rev A; PackageReference: S8; PackageDescription: 8-Pin Plastic Small Outline (Narrow .150 Inch), Body 4.9 x 3.9 mm, Pitch 1.27 mm; Supplier 1: Digi-Key; Supplier Part Number 1: LTC1540CS8#TRPBF-ND; Supplier 2: Newark; Supplier Part Number 2: 56M1867; Features: Reference, Comparator; RoHS: Y; Vos (mV) Typical: 12; Mounting Technology: Surface Mount; ComponentLink1Description: Manufacturer URL; ComponentLink1URL: http://www.linear.com/; ComponentLink2Description: Datasheet; ComponentLink2URL: http://cds.linear.com/docs/en/datasheet/1540fas.pdf; ComponentLink3Description: Package Specification; ComponentLink3URL: http://cds.linear.com/docs/en/packaging/05081610_G_SO8.pdf
footprint LT-S8_N (SOP, 8-Leads, Body 4.9x3.9mm, Pitch 1.27mm, IPC Medium Density)
footprint LT-S8_L (SOP, 8-Leads, Body 4.9x3.9mm, Pitch 1.27mm, IPC High Density)
footprint LT-S8_M (SOP, 8-Leads, Body 4.9x3.9mm, Pitch 1.27mm, IPC Low Density)
pins: 1 GND (power), 2 V- (power), 3 IN+ (in), 4 IN- (in), 5 HYST, 6 REF (out), 7 V+ (power), 8 OUT (out)

## LTC1540IDD
designator U?
Nanopower Comparator with Reference, 1 Channel, 2 to 11 V, -40 to +85 degC, 8-pin Plastic DFN (DD8); Generic Part Number: LTC1540; Manufacturer: Linear Technology; PartNumber: LTC1540IDD; Channels (#): 1; Prop Delay (us): 50; Supply Current (uA) Guaranteed: 0.68; Supply Current (uA) Typical: 0.3; Supply Voltage Range: 2 to 11 V; Vos (mV) Guaranteed: 12; Vs Max (V): 11; Vs Min (V): 2; DatasheetVersion: Rev A; PackageReference: DD8; PackageDescription: 8-Pin Plastic DFN, Body 3 × 3 mm, Pitch 0.5 mm; Supplier 1: Digi-Key; Supplier Part Number 1: LTC1540IDD-ND; Supplier 2: Newark; Supplier Part Number 2: 56M1868; Features: Reference, Comparator; RoHS: N; Vos (mV) Typical: 12; Mounting Technology: Surface Mount; Code_JEDEC: M0-229; ComponentLink1Description: Manufacturer URL; ComponentLink1URL: http://www.linear.com/; ComponentLink2Description: Datasheet; ComponentLink2URL: http://cds.linear.com/docs/en/datasheet/1540fas.pdf; ComponentLink3Description: Package Specification; ComponentLink3URL: http://cds.linear.com/docs/en/packaging/DFN_8_05-08-1698.pdf
footprint LT-DD8_V (SON, 8-Leads, Body 3x3mm, Pitch 0.5mm, Thermal Pad 2.38x1.65mm)
pins: 1 GND (power) "Ground. Connect to V- for single supply operation.", 2 V- (power) "Negative Supply. Potential should be more negative than GND. Connect to ground for single supply operation.", 3 IN+ (in) "Noninverting Comparator Input. Input common mode range from V- to V+ -1.3V. Input current typically 10pA at 25degreesC.", 4 IN- (in) "Inverting Comparator Input. Input common mode range from V- to V+ -1.3V. Input current typically 10pA at 25degreesC.", 5 HYST "Hysteresis Input. Connect to REF if not used. Input voltage range is from VREF to VREF-50mV.", 6 REF (out) "Reference Output. 1.182V with respect to V-. Can source up to 1mA and sink 10uA at 25degreesC. Drive 0.01uF bypass capacitor without oscillation.", 7 V+ (power) "Positive Supply operating voltage is from 2V to 11V.", 8 OUT (out) "Comparator CMOS Output. Swings from GND to V+. Output can source up to 40mA and sink 5mA.", 9 EP (power) "Exposed Pad"

## LTC1540IDD#PBF
designator U?
Nanopower Comparator with Reference, 1 Channel, 2 to 11 V, -40 to +85 degC, 8-pin Plastic DFN (DD8); Generic Part Number: LTC1540; Manufacturer: Linear Technology; PartNumber: LTC1540IDD#PBF; Channels (#): 1; Prop Delay (us): 50; Supply Current (uA) Guaranteed: 0.68; Supply Current (uA) Typical: 0.3; Supply Voltage Range: 2 to 11 V; Vos (mV) Guaranteed: 12; Vs Max (V): 11; Vs Min (V): 2; DatasheetVersion: Rev A; PackageReference: DD8; PackageDescription: 8-Pin Plastic DFN, Body 3 × 3 mm, Pitch 0.5 mm; Supplier 1: Digi-Key; Supplier Part Number 1: LTC1540IDD#PBF-ND; Supplier 2: Farnell; Supplier Part Number 2: 2295501; Supplier 3: Newark; Supplier Part Number 3: 56M1869; Features: Reference, Comparator; RoHS: Y; Vos (mV) Typical: 12; Mounting Technology: Surface Mount; Code_JEDEC: M0-229; ComponentLink1Description: Manufacturer URL; ComponentLink1URL: http://www.linear.com/; ComponentLink2Description: Datasheet; ComponentLink2URL: http://cds.linear.com/docs/en/datasheet/1540fas.pdf; ComponentLink3Description: Package Specification; ComponentLink3URL: http://cds.linear.com/docs/en/packaging/DFN_8_05-08-1698.pdf
footprint LT-DD8_V (SON, 8-Leads, Body 3x3mm, Pitch 0.5mm, Thermal Pad 2.38x1.65mm)
pins: 1 GND (power) "Ground. Connect to V- for single supply operation.", 2 V- (power) "Negative Supply. Potential should be more negative than GND. Connect to ground for single supply operation.", 3 IN+ (in) "Noninverting Comparator Input. Input common mode range from V- to V+ -1.3V. Input current typically 10pA at 25degreesC.", 4 IN- (in) "Inverting Comparator Input. Input common mode range from V- to V+ -1.3V. Input current typically 10pA at 25degreesC.", 5 HYST "Hysteresis Input. Connect to REF if not used. Input voltage range is from VREF to VREF-50mV.", 6 REF (out) "Reference Output. 1.182V with respect to V-. Can source up to 1mA and sink 10uA at 25degreesC. Drive 0.01uF bypass capacitor without oscillation.", 7 V+ (power) "Positive Supply operating voltage is from 2V to 11V.", 8 OUT (out) "Comparator CMOS Output. Swings from GND to V+. Output can source up to 40mA and sink 5mA.", 9 EP (power) "Exposed Pad"
